# Altium footprint library ICs And Semiconductors SMD.PcbLib: 943 footprints (part 7 of 60) (continued)
## HAMAMATSU_S13361-2050NE-08 [mm] "2x2mm, 64 Channel (8x8) TSV MPPC (Multi-Pixel Photon Counter), Body 17.8 x 17.8 x 1.55mm" (continued)
  text "1" at -9.875,7.1 h1
  text "H" at 7.27,9.5 h1
  text "G" at 5.101,9.5 h1
  text "F" at 2.93,9.5 h1
  text "E" at 0.73,9.5 h1
  text "D" at -1.564,9.5 h1
  text "C" at -3.642,9.5 h1
  text "B" at -5.93,9.5 h1
  text "A" at -8.19,9.5 h1
Mechanical 15:
  lines w0.1: -9.15,-9.15 9.15,-9.15 9.15,9.15 -9.15,9.15 -9.15,-9.15
3D body "HAMAMATSU_S13361-2050NE-08_part1.stp": height 1.45, standoff 0, extent -8.9,-8.9 8.9,8.9
3D body "HAMAMATSU_S13361-2050NE-08_part2.stp": height 1.55, standoff 1.15, extent -8.9,-8.9 8.9,8.9

## HAMLIN_59170-1-X-00-C [mm] "SMD Proximity Sensor, HAMLIN 59170 Serie"
height 2.41
pads (2):
  rect 2.03x1.14 smd: 1(-7.425,0) 2(7.425,0)
Top Overlay:
  lines w0.2: -5.715,-1.145 -5.715,1.145 5.715,1.145 5.715,-1.145 -5.715,-1.145
Mechanical 8:
  lines w0.1: -7.925,0 -7.425,0 ; -7.425,-0.5 -7.425,0 ; -7.425,0.5 -7.425,0 ; -6.925,0 -7.425,0 ; -0.5,0 0,0 ; 0,-0.5 0,0 ; 0,0.5 0,0 ; 0.5,0 0,0 ; 6.925,0 7.425,0 ; 7.425,-0.5 7.425,0 ; 7.425,0.5 7.425,0 ; 7.925,0 7.425,0 ; -8.44,-0.57 -6.41,-0.57 -6.41,0.57 -8.44,0.57 -8.44,-0.57 ; 6.41,-0.57 8.44,-0.57 8.44,0.57 6.41,0.57 6.41,-0.57
Mechanical 14:
  lines w0.1: -5.715,-0.215 -8.125,-0.215 -8.125,0.215 -5.715,0.215 ; 5.715,-0.215 8.125,-0.215 8.125,0.215 5.715,0.215 ; -5.715,-1.145 -5.715,1.145 5.715,1.145 5.715,-1.145 -5.715,-1.145
3D body "HAMLIN_59170-1-X-00-C.stp": height 2.29, standoff 0, extent -8.125,-1.145 8.125,1.145

## HOEBEN_HE244S [mm] "HE244 Series Analog Hall Sensor, Body 3mm x 5mm X 0.8mm"
height 0.8
Top Overlay:
  lines w0.2: -1.5,-3.15 1.5,-3.15 ; -1.5,-4.45 1.5,-4.45 1.5,0.55 -1.5,0.55 -1.5,-4.45 ; -1.3,-4.3 -1.3,-3.15 -1.1,-3.15 -1.1,-4.3 -1.3,-4.3 ; -0.5,-4.3 -0.5,-3.15 -0.3,-3.15 -0.3,-4.3 -0.5,-4.3 ; 0.3,-4.3 0.3,-3.15 0.5,-3.15 0.5,-4.3 0.3,-4.3 ; 1.1,-4.3 1.1,-3.15 1.3,-3.15 1.3,-4.3 1.1,-4.3
  text "1" at 0.85,-2.775 h1
Mechanical 8:
  lines w0.1: -0.5,0 0,0 ; 0,-0.5 0,0 ; 0,0.5 0,0 ; 0.15,-1 0.375,-1 0.375,-0.375 0.2,-0.2 ; 0.425,-0.2 0.2,-0.2 ; 0.5,0 0,0 ; 0.2,-0.2 0.2,-0.425 0.2,-0.2
  text "Die" at -1.3,-1.175 h0.5
  text "Center" at -1.325,-1.875 h0.5
Mechanical 14:
  lines w0.1: -1.5,-3.15 1.5,-3.15 ; -1.5,-4.45 1.5,-4.45 1.5,0.55 -1.5,0.55 -1.5,-4.45 ; -1.35,-4.35 -1.35,-3.15 -1.05,-3.15 -1.05,-4.35 -1.35,-4.35 ; -0.55,-4.35 -0.55,-3.15 -0.25,-3.15 -0.25,-4.35 -0.55,-4.35 ; -0.2,-0.2 0.2,-0.2 0.2,0.2 -0.2,0.2 -0.2,-0.2 ; 0.25,-4.35 0.25,-3.15 0.55,-3.15 0.55,-4.35 0.25,-4.35 ; 1.05,-4.35 1.05,-3.15 1.35,-3.15 1.35,-4.35 1.05,-4.35
  text "1" at 0.85,-2.775 h1
Mechanical 15:
  lines w0.05: -1.75,-4.7 1.75,-4.7 1.75,0.8 -1.75,0.8 -1.75,-4.7
3D body "HOEBEN_HE244S.stp": height 0.8, standoff 0, extent -1.5,-4.45 1.5,0.55

## HOEBEN_HE444 [mm] "HE444 Series 3D Analog Hall sensor, Body 3.3mm x 3.3mm X 3.3mm"
height 3.3
pads (16):
  rect 0.8x0.35 smd: 1(-1.6,0.825) 2(-1.6,0.275) 3(-1.6,-0.275) 4(-1.6,-0.825) 9(1.6,-0.825) 10(1.6,-0.275) 11(1.6,0.275) 12(1.6,0.825)
  rect 0.35x0.8 smd: 5(-0.825,-1.6) 6(-0.275,-1.6) 7(0.275,-1.6) 8(0.825,-1.6) 13(0.825,1.6) 14(0.275,1.6) 15(-0.275,1.6) 16(-0.825,1.6)
Top Overlay:
  circle w0.25: c-2.6,0.825 r0.125
  lines w0.2: -1.65,-1.35 -1.65,-1.65 -1.35,-1.65 ; -1.65,1.35 -1.65,1.41 -1.41,1.65 -1.35,1.65 ; 1.35,-1.65 1.65,-1.65 1.65,-1.35 ; 1.35,1.65 1.65,1.65 1.65,1.35
Mechanical 14:
  lines w0.1: -1.65,0.65 -0.65,1.65 ; -1.65,0.75 -0.75,1.65 ; -1.65,0.85 -0.85,1.65 ; -1.65,0.95 -0.95,1.65 ; -1.65,1.05 -1.05,1.65 ; -1.65,1.15 -1.15,1.65 ; -1.65,1.25 -1.25,1.65 ; -1.65,1.35 -1.35,1.65 ; -1.65,1.45 -1.45,1.65 ; -1.65,1.55 -1.55,1.65 ; -1.65,-1.65 -1.65,1.65 1.65,1.65 1.65,-1.65 -1.65,-1.65
  text "Z" at 0.6,-0.3 h0.5
  text "Y" at -0.175,-0.95 h0.5
  text "NC" at -0.375,0.5 h0.5
  text "X" at -0.975,-0.325 h0.5
Mechanical 15:
  circle w0.05: c0,0 r0.35
  lines w0.05: -0.5,0 0.5,0 ; 0,-0.5 0,0.5 ; -2.25,-2.25 -2.25,2.25 2.25,2.25 2.25,-2.25 -2.25,-2.25
3D body "HOEBEN_HE444.stp": height 3.31, standoff 0, extent -1.66,-1.66 1.66,1.66

## INFINEON-PG-SOT343-4 [mm] "INFINEON PG-SOT343-4, SOT343, 1.30mm Pitch; 4 Pin,1.25mm W X 2.00mm L X 1.10mm H body, IPC Medium Density"
height 1.1
pads (4):
  rect 0.8x0.6 smd: 1(-0.8,0.65) 3(0.8,-0.65) 4(0.8,0.65)
  rect 0.8x0.9 smd: 2(-0.8,-0.5)
Top Overlay:
  circle w0.25: c-1.2,1.4 r0.125
  lines w0.2: 0,-1.1 0,1.1
Mechanical 8:
  lines w0.1: -1.3,-0.5 -0.8,-0.5 ; -1.3,0.65 -0.8,0.65 ; -0.8,-1 -0.8,-0.5 ; -0.8,0 -0.8,-0.5 ; -0.8,0.15 -0.8,0.65 ; -0.8,1.15 -0.8,0.65 ; -0.5,0 0,0 ; -0.3,-0.5 -0.8,-0.5 ; -0.3,0.65 -0.8,0.65 ; 0,-0.5 0,0 ; 0,0.5 0,0 ; 0.3,-0.65 0.8,-0.65 ; 0.3,0.65 0.8,0.65 ; 0.5,0 0,0 ; 0.8,-1.15 0.8,-0.65 ; 0.8,-0.15 0.8,-0.65 ; 0.8,0.15 0.8,0.65 ; 0.8,1.15 0.8,0.65 ; 1.3,-0.65 0.8,-0.65 ; 1.3,0.65 0.8,0.65 ; -1.2,-0.95 -0.4,-0.95 -0.4,-0.05 -1.2,-0.05 -1.2,-0.95 ; -1.2,0.35 -0.4,0.35 -0.4,0.95 -1.2,0.95 -1.2,0.35 ; 0.4,-0.95 1.2,-0.95 1.2,-0.35 0.4,-0.35 0.4,-0.95 ; 0.4,0.35 1.2,0.35 1.2,0.95 0.4,0.95 0.4,0.35
Mechanical 14:
  circle w0.1: c-0.342,0.8 r0.15
  lines w0.1: -0.675,-1.1 -0.675,1.1 0.675,1.1 0.675,-1.1 -0.675,-1.1
Mechanical 15:
  lines w0.05: -1.45,-1.35 1.45,-1.35 1.45,1.35 -1.45,1.35 -1.45,-1.35
3D body "INFINEON-PG-SOT343-4.stp": height 1.1, standoff 0, extent -1.05,-1.1 1.05,1.1

## INFINEON-PG-SOT343-4 - IPC [mm] "INFINEON PG-SOT343-4, SOT343, 1.30mm Pitch; 4 Pin,1.25mm W X 2.00mm L X 1.10mm H body, IPC Medium Density"
height 1.1
pads (4):
  rect 0.85x0.5 smd: 1(-1.05,0.65) 3(1.05,-0.65) 4(1.05,0.65)
  rect 0.85x0.8 smd: 2(-1.05,-0.5)
Top Overlay:
  circle w0.25: c-1.2,1.4 r0.125
  lines w0.2: -0.3,-1 -0.3,1 0.3,1 0.3,-1 -0.3,-1
Mechanical 14:
  lines w0.1: -0.625,0 0.375,1 ; -0.625,0.1 0.275,1 ; -0.625,0.2 0.175,1 ; -0.625,0.3 0.075,1 ; -0.625,0.4 -0.025,1 ; -0.625,0.5 -0.125,1 ; -0.625,0.6 -0.225,1 ; -0.625,0.7 -0.325,1 ; -0.625,0.8 -0.425,1 ; -0.625,0.9 -0.525,1 ; -0.625,-1 -0.625,1 0.625,1 0.625,-1 -0.625,-1
Mechanical 15:
  circle w0.05: c0,0 r0.35
  lines w0.05: -0.5,0 0.5,0 ; 0,-0.5 0,0.5 ; -1.75,-1.35 -1.75,1.35 1.75,1.35 1.75,-1.35 -1.75,-1.35
3D body "INFINEON-PG-SOT343-4.stp": height 1.1, standoff 0, extent -1.05,-1.1 1.05,1.1

## INFINEON-PG-TDSON-8 [mm] "TDSON, 8-Leads, Body 6.15x5.15mm, Pitch 1.27mm"
height 1
pads (9):
  rect 1.2x0.65 smd: 1(-2.825,1.905) 2(-2.825,0.635) 3(-2.825,-0.635) 4(-2.825,-1.905)
  rect 4.5x4.7 smd: D(0.675,0)
  rect 1.2x0.7 smd: D(2.825,-2) D(2.825,-0.665) D(2.825,0.665) D(2.825,2)
Top Overlay:
  circle w0.25: c-3.925,1.95 r0.125
  lines w0.2: -2.95,-2.53 -2.95,-2.575 -1.875,-2.575 ; -2.95,2.53 -2.95,2.575 -1.875,2.575 ; -1.275,-2.65 -1.275,-2.695 -0.835,-2.695 -0.835,-2.65 ; -1.275,2.65 -1.275,2.695 -0.835,2.695 -0.835,2.65
Mechanical 8:
  lines w0.1: -0.354,-0.354 0,0 ; -0.354,0.354 0,0 ; 0.175,0 0.675,0 ; 0.354,-0.354 0,0 ; 0.354,0.354 0,0 ; 0.675,-0.5 0.675,0 ; 0.675,0.5 0.675,0 ; 1.175,0 0.675,0 ; -3.425,-2.23 -2.825,-1.905 -3.425,-1.58 ; -3.425,-2.23 -2.225,-2.23 -2.225,-1.58 -3.425,-1.58 ; -3.425,-2.23 -3.425,-1.58 ; -3.425,-0.96 -2.825,-0.635 -3.425,-0.31 ; -3.425,-0.96 -2.225,-0.96 -2.225,-0.31 -3.425,-0.31 ; -3.425,-0.96 -3.425,-0.31 ; -3.425,0.31 -2.825,0.635 -3.425,0.96 ; -3.425,0.31 -2.225,0.31 -2.225,0.96 -3.425,0.96 ; -3.425,0.31 -3.425,0.96 ; -3.425,1.58 -2.825,1.905 -3.425,2.23 ; -3.425,1.58 -2.225,1.58 -2.225,2.23 -3.425,2.23 ; -3.425,1.58 -3.425,2.23 ; -1.575,-2.35 2.925,2.35 -1.575,2.35 ; -1.575,-2.35 -1.575,2.35 ; -1.575,-2.35 2.925,-2.35 -1.575,2.35 ; 3.425,-2.35 3.425,-1.65 ; 3.425,-2.35 2.825,-2 3.425,-1.65 ; 3.425,-2.35 3.425,-1.65 ; 3.425,-2.35 2.225,-2.35 2.225,-1.65 3.425,-1.65 ; 3.425,-1.65 2.925,-1.65 2.925,-1.015 3.425,-1.015 ; 3.425,-1.015 3.425,-0.315 ; 3.425,-1.015 2.825,-0.665 3.425,-0.315 ; 3.425,-1.015 3.425,-0.315 ; 3.425,-1.015 2.225,-1.015 2.225,-0.315 3.425,-0.315 ; 3.425,-0.315 2.925,-0.315 2.925,0.315 3.425,0.315 ; 3.425,0.315 3.425,1.015 ; 3.425,0.315 2.825,0.665 3.425,1.015 ; 3.425,0.315 3.425,1.015 ; 3.425,0.315 2.225,0.315 2.225,1.015 3.425,1.015 ; 3.425,1.015 2.925,1.015 2.925,1.65 3.425,1.65 ; 3.425,1.65 3.425,2.35 ; 3.425,1.65 2.825,2 3.425,2.35 ; 3.425,1.65 3.425,2.35 ; 3.425,1.65 2.225,1.65 2.225,2.35 3.425,2.35
Mechanical 14:
  lines w0.1: -2.95,-2.125 -3.075,-2.125 -3.075,-1.685 -2.95,-1.685 ; -2.95,-0.855 -3.075,-0.855 -3.075,-0.415 -2.95,-0.415 ; -2.95,0.415 -3.075,0.415 -3.075,0.855 -2.95,0.855 ; -2.95,1.575 -1.95,2.575 ; -2.95,1.675 -2.05,2.575 ; -2.95,1.685 -3.075,1.685 -3.075,2.125 -2.95,2.125 ; -2.95,1.775 -2.15,2.575 ; -2.95,1.875 -2.25,2.575 ; -2.95,1.975 -2.35,2.575 ; -2.95,2.075 -2.45,2.575 ; -2.95,2.175 -2.55,2.575 ; -2.95,2.275 -2.65,2.575 ; -2.95,2.375 -2.75,2.575 ; -2.95,2.475 -2.85,2.575 ; -1.275,-2.575 -1.275,-2.695 -0.835,-2.695 -0.835,-2.575 ; -1.275,2.575 -1.275,2.695 -0.835,2.695 -0.835,2.575 ; 2.95,-2.125 3.075,-2.125 3.075,-1.685 2.95,-1.685 ; 2.95,-0.855 3.075,-0.855 3.075,-0.415 2.95,-0.415 ; 2.95,0.415 3.075,0.415 3.075,0.855 2.95,0.855 ; 2.95,1.685 3.075,1.685 3.075,2.125 2.95,2.125 ; -2.95,-2.575 -2.95,2.575 2.95,2.575 2.95,-2.575 -2.95,-2.575
Mechanical 15:
  lines w0.05: -3.675,-2.945 -3.675,2.945 3.675,2.945 3.675,-2.945 -3.675,-2.945
3D body "INFINEON-PG-TDSON-8.stp": height 1.1, standoff 0, extent -3.075,-2.75 3.075,2.75

## INFINEON-PG-TSDSON-8 [mm] "TSDSON, 8-Leads, Body 3.4x3.4mm, Pitch 0.65mm"
height 1.1
pads (9):
  rect 0.8x0.34 smd: 1(-1.5,0.975) 2(-1.5,0.325) 3(-1.5,-0.325) 4(-1.5,-0.975)
  rect 1.71x2.29 smd: D(0.395,0)
  rect 0.65x0.34 smd: D(1.575,-0.975) D(1.575,-0.325) D(1.575,0.325) D(1.575,0.975)
Top Overlay:
  circle w0.25: c-2.6,1.02 r0.125
  lines w0.2: -1.7,-1.495 -1.7,-1.7 1.7,-1.7 1.7,-1.495 ; -1.7,1.495 -1.7,1.7 1.7,1.7 1.7,1.495
Mechanical 8:
  lines w0.05: -0.354,-0.354 0,0 ; -0.354,0.354 0,0 ; -0.105,0 0.395,0 ; 0.354,-0.354 0,0 ; 0.354,0.354 0,0 ; 0.395,-0.5 0.395,0 ; 0.395,0.5 0.395,0 ; 0.895,0 0.395,0 ; -1.9,-1.145 -1.5,-0.975 -1.9,-0.805 ; -1.9,-1.145 -1.9,-0.805 ; -1.9,-1.145 -1.1,-1.145 -1.1,-0.805 -1.9,-0.805 ; -1.9,-0.495 -1.5,-0.325 -1.9,-0.155 ; -1.9,-0.495 -1.9,-0.155 ; -1.9,-0.495 -1.1,-0.495 -1.1,-0.155 -1.9,-0.155 ; -1.9,0.155 -1.5,0.325 -1.9,0.495 ; -1.9,0.155 -1.9,0.495 ; -1.9,0.155 -1.1,0.155 -1.1,0.495 -1.9,0.495 ; -1.9,0.805 -1.5,0.975 -1.9,1.145 ; -1.9,0.805 -1.9,1.145 ; -1.9,0.805 -1.1,0.805 -1.1,1.145 -1.9,1.145 ; 1.9,-1.145 1.575,-0.975 1.9,-0.805 ; 1.9,-1.145 -0.46,-1.145 -0.46,1.145 1.9,1.145 ; 1.9,-1.145 1.9,-0.805 ; 1.9,-0.805 1.25,-0.805 1.25,-0.495 1.9,-0.495 ; 1.9,-0.495 1.575,-0.325 1.9,-0.155 ; 1.9,-0.495 1.9,-0.155 ; 1.9,-0.155 1.25,-0.155 1.25,0.155 1.9,0.155 ; 1.9,0.155 1.575,0.325 1.9,0.495 ; 1.9,0.155 1.9,0.495 ; 1.9,0.495 1.25,0.495 1.25,0.805 1.9,0.805 ; 1.9,0.805 1.575,0.975 1.9,1.145 ; 1.9,0.805 1.9,1.145
Mechanical 14:
  lines w0.1: -1.7,-1.7 -1.7,1.7 1.7,1.7 1.7,-1.7 -1.6,-1.7 ; -1.7,0.7 -0.7,1.7 ; -1.7,0.8 -0.8,1.7 ; -1.7,0.9 -0.9,1.7 ; -1.7,1 -1,1.7 ; -1.7,1.1 -1.1,1.7 ; -1.7,1.2 -1.2,1.7 ; -1.7,1.3 -1.3,1.7 ; -1.7,1.4 -1.4,1.7 ; -1.7,1.5 -1.5,1.7 ; -1.7,1.6 -1.6,1.7
Mechanical 15:
  lines w0.05: -2.15,-1.95 2.15,-1.95 2.15,1.95 -2.15,1.95 -2.15,-1.95
3D body "INFINEON-PG-TSDSON-8.stp": height 1, standoff 0, extent -1.7,-1.7 1.7,1.7

## INTERSIL_L72.10x10E [mm] "INTERSIL Case Style L72.10x10E, QFN, 0.50mm Pitch, Square; 72 Pin, 10.00mm L X 10.00mm W X 1.00mm H body (w/ Thermal Tab 7.15 X 6mm)"
height 0.9
pads (75):
  oval 0.9x0.25 smd: 1(-4.95,4.25) 2(-4.95,3.75) 3(-4.95,3.25) 4(-4.95,2.75) 5(-4.95,2.25) 6(-4.95,1.75) 7(-4.95,1.25) 8(-4.95,0.75) 9(-4.95,0.25) 10(-4.95,-0.25) 11(-4.95,-0.75) 12(-4.95,-1.25) 13(-4.95,-1.75) 14(-4.95,-2.25) 15(-4.95,-2.75) 16(-4.95,-3.25) 17(-4.95,-3.75) 18(-4.95,-4.25) 37(4.95,-4.25) 38(4.95,-3.75) 39(4.95,-3.25) 40(4.95,-2.75) 41(4.95,-2.25) 42(4.95,-1.75) 43(4.95,-1.25) 44(4.95,-0.75) 45(4.95,-0.25) 46(4.95,0.25) 47(4.95,0.75) 48(4.95,1.25) 49(4.95,1.75) 50(4.95,2.25) 51(4.95,2.75) 52(4.95,3.25) 53(4.95,3.75) 54(4.95,4.25)
  oval 0.25x0.9 smd: 19(-4.25,-4.95) 20(-3.75,-4.95) 21(-3.25,-4.95) 22(-2.75,-4.95) 23(-2.25,-4.95) 24(-1.75,-4.95) 25(-1.25,-4.95) 26(-0.75,-4.95) 27(-0.25,-4.95) 28(0.25,-4.95) 29(0.75,-4.95) 30(1.25,-4.95) 31(1.75,-4.95) 32(2.25,-4.95) 33(2.75,-4.95) 34(3.25,-4.95) 35(3.75,-4.95) 36(4.25,-4.95) 55(4.25,4.95) 56(3.75,4.95) 57(3.25,4.95) 58(2.75,4.95) 59(2.25,4.95) 60(1.75,4.95) 61(1.25,4.95) 62(0.75,4.95) 63(0.25,4.95) 64(-0.25,4.95) 65(-0.75,4.95) 66(-1.25,4.95) 67(-1.75,4.95) 68(-2.25,4.95) 69(-2.75,4.95) 70(-3.25,4.95) 71(-3.75,4.95) 72(-4.25,4.95)
  rect 7.15x6 smd: 73(-0.575,0)
  round 1 smd paste-0.51 mask+0.5: FTG1(-5.707,-5.707) FTG2(5.707,5.707)
Top Layer keep-out:
  circle w0.1: c-5.707,-5.707 r1
  circle w0.1: c5.707,5.707 r1
Top Overlay:
  circle w0.25: c-6,4.25 r0.125
  lines w0.2: -5,-4.75 -5,-5 -4.75,-5 ; -5,4.75 -5,4.8 -4.8,5 -4.75,5 ; 4.75,-5 5,-5 5,-4.75 ; 4.75,5 5,5 5,4.75
Top Paste:
  region: -3.545,-2.2 -1.965,-2.2 -1.965,-0.4 -3.545,-0.4
  region: -1.365,-2.2 0.215,-2.2 0.215,-0.4 -1.365,-0.4
  region: 0.815,-2.2 2.395,-2.2 2.395,-0.4 0.815,-0.4
  region: -3.545,0.4 -1.965,0.4 -1.965,2.2 -3.545,2.2
  region: -1.365,0.4 0.215,0.4 0.215,2.2 -1.365,2.2
  region: 0.815,0.4 2.395,0.4 2.395,2.2 0.815,2.2
Mechanical 14:
  circle w0.1: c-4,4 r0.5
  lines w0.1: -5,-5 5,-5 5,5 -5,5 -5,-5
Mechanical 15:
  circle w0.05: c0,0 r0.35
  lines w0.05: -0.5,0 0.5,0 ; 0,-0.5 0,0.5 ; -5.65,-5.65 5.65,-5.65 5.65,5.65 -5.65,5.65 -5.65,-5.65
3D body "INTERSIL_L72.10x10E.stp": height 0.9, standoff 0, extent -5,-5 5,5

## IR_DIRECTFET-L8 [mm] "INTERNATIONAL RECTIFIER DirectFET L8 (Large Size Can) Outline, Body 9.1x6.97mm"
height 0.74
pads (15):
  rect 1.1x1.7 smd: D(-4.35,-2.2) D(-4.35,0) D(-4.35,2.2) D(4.35,-2.2) D(4.35,0) D(4.35,2.2)
  rect 0.7x1.3 smd: G(-2.1,0)
  rect 1.1x0.85 smd: S(-0.7,-1.725) S(-0.7,-0.575) S(-0.7,0.575) S(-0.7,1.725) S(2.1,-1.725) S(2.1,-0.575) S(2.1,0.575) S(2.1,1.725)
Top Overlay:
  lines w0.2: -3.838,-3.4 -3.75,-3.487 3.75,-3.487 3.838,-3.4 ; -3.838,3.4 -3.75,3.487 3.75,3.487 3.838,3.4 ; -3.45,-3.356 ccw(c-3.35,-2.987) -3.35,-3.369 3.35,-3.369 ccw(c3.35,-2.987) 3.45,-3.356 ; -3.45,3.356 cw(c-3.35,2.987) -3.35,3.369 3.35,3.369 cw(c3.35,2.987) 3.45,3.356
Mechanical 8:
  lines w0.1: -4.85,-2.2 -4.35,-2.2 ; -4.85,0 -4.35,0 ; -4.85,2.2 -4.35,2.2 ; -4.35,-2.7 -4.35,-2.2 ; -4.35,-1.7 -4.35,-2.2 ; -4.35,-0.5 -4.35,0 ; -4.35,0.5 -4.35,0 ; -4.35,1.7 -4.35,2.2 ; -4.35,2.7 -4.35,2.2 ; -3.85,-2.2 -4.35,-2.2 ; -3.85,0 -4.35,0 ; -3.85,2.2 -4.35,2.2 ; -2.6,0 -2.1,0 ; -2.1,-0.5 -2.1,0 ; -2.1,0.5 -2.1,0 ; -1.6,0 -2.1,0 ; -1.2,-1.725 -0.7,-1.725 ; -1.2,-0.575 -0.7,-0.575 ; -1.2,0.575 -0.7,0.575 ; -1.2,1.725 -0.7,1.725 ; -0.7,-2.225 -0.7,-1.725 ; -0.7,-1.225 -0.7,-1.725 ; -0.7,-1.075 -0.7,-0.575 ; -0.7,-0.075 -0.7,-0.575 ; -0.7,0.075 -0.7,0.575 ; -0.7,1.075 -0.7,0.575 ; -0.7,1.225 -0.7,1.725 ; -0.7,2.225 -0.7,1.725 ; -0.5,0 0,0 ; -0.2,-1.725 -0.7,-1.725 ; -0.2,-0.575 -0.7,-0.575 ; -0.2,0.575 -0.7,0.575 ; -0.2,1.725 -0.7,1.725 ; 0,-0.5 0,0 ; 0,0.5 0,0 ; 0.5,0 0,0 ; 1.6,-1.725 2.1,-1.725 ; 1.6,-0.575 2.1,-0.575 ; 1.6,0.575 2.1,0.575 ; 1.6,1.725 2.1,1.725 ; 2.1,-2.225 2.1,-1.725 ; 2.1,-1.225 2.1,-1.725 ; 2.1,-1.075 2.1,-0.575 ; 2.1,-0.15 2.1,0.15 ; 2.1,-0.075 2.1,-0.575 ; 2.1,0.075 2.1,0.575 ; 2.1,1.075 2.1,0.575 ; 2.1,1.225 2.1,1.725 ; 2.1,2.225 2.1,1.725 ; 2.6,-1.725 2.1,-1.725 ; 2.6,-0.575 2.1,-0.575 ; 2.6,0.575 2.1,0.575 ; 2.6,1.725 2.1,1.725 ; 3.85,-2.2 4.35,-2.2 ; 3.85,0 4.35,0 ; 3.85,2.2 4.35,2.2 ; 4.35,-2.7 4.35,-2.2 ; 4.35,-1.7 4.35,-2.2 ; 4.35,-0.5 4.35,0 ; 4.35,0.5 4.35,0 ; 4.35,1.7 4.35,2.2 ; 4.35,2.7 4.35,2.2 ; 4.85,-2.2 4.35,-2.2 ; 4.85,0 4.35,0 ; 4.85,2.2 4.35,2.2 ; -4.9,-3.05 -3.8,-3.05 -3.8,-1.35 -4.9,-1.35 -4.9,-3.05 ; -4.9,-0.85 -3.8,-0.85 -3.8,0.85 -4.9,0.85 -4.9,-0.85 ; -4.9,1.35 -3.8,1.35 -3.8,3.05 -4.9,3.05 -4.9,1.35 ; -2.45,-0.65 -1.75,-0.65 -1.75,0.65 -2.45,0.65 -2.45,-0.65 ; -1.25,-2.15 -1.25,-1.3 -0.15,-1.3 -0.15,-2.15 -1.25,-2.15 ; -1.25,-1 -1.25,-0.15 -0.15,-0.15 -0.15,-1 -1.25,-1 ; -1.25,0.15 -1.25,1 -0.15,1 -0.15,0.15 -1.25,0.15 ; -1.25,1.3 -1.25,2.15 -0.15,2.15 -0.15,1.3 -1.25,1.3 ; 1.55,-2.15 1.55,-1.3 2.65,-1.3 2.65,-2.15 1.55,-2.15 ; 1.55,-1 1.55,-0.15 2.65,-0.15 2.65,-1 1.55,-1 ; 1.55,0.15 1.55,1 2.65,1 2.65,0.15 1.55,0.15 ; 1.55,1.3 1.55,2.15 2.65,2.15 2.65,1.3 1.55,1.3 ; 3.8,-3.05 4.9,-3.05 4.9,-1.35 3.8,-1.35 3.8,-3.05 ; 3.8,-0.85 4.9,-0.85 4.9,0.85 3.8,0.85 3.8,-0.85 ; 3.8,1.35 4.9,1.35 4.9,3.05 3.8,3.05 3.8,1.35
Mechanical 14:
  lines w0.1: -3.9,-3.025 -3.95,-2.975 -4.55,-2.975 -4.55,2.975 -3.95,2.975 -3.9,3.025 ; 3.9,3.025 3.95,2.975 4.55,2.975 4.55,-2.975 3.95,-2.975 3.901,-3.013 ; 3.9,3.337 3.75,3.487 -3.75,3.487 -3.9,3.337 -3.9,-3.337 -3.75,-3.487 3.75,-3.487 3.9,-3.337 3.901,3.339 ; -3.732,-2.987 ccw(c-3.35,-2.987) -3.35,-3.369 3.35,-3.369 ccw(c3.35,-2.987) 3.732,-2.987 3.732,2.987 ccw(c3.35,2.987) 3.35,3.369 -3.35,3.369 ccw(c-3.35,2.987) -3.732,2.987 -3.732,-2.987
Mechanical 15:
  lines w0.05: -5.15,-3.3 -5.15,3.3 -4.15,3.3 -4.15,3.738 4.149,3.738 4.151,3.3 5.15,3.3 5.15,-3.3 4.15,-3.3 4.15,-3.738 -4.15,-3.738 -4.15,-3.3 -5.15,-3.3
3D body "IR_DIRECTFET-L8.stp": height 0.74, standoff 0, extent -4.55,-3.487 4.55,3.488

## IST_P14-FEMTOCAP-G [mm] "Chip SMD, Body 4 x 2mm"
height 0.5
pads (2):
  rect 1.15x2.2 smd: 1(-1.9,0) 2(1.9,0)
Top Overlay:
  lines w0.1: -0.975,-1.1 0.975,-1.1 ; -0.975,1.1 0.975,1.1
Mechanical 8:
  lines w0.1: -2.4,0 -1.9,0 ; -1.9,-0.5 -1.9,0 ; -1.9,0.5 -1.9,0 ; -1.4,0 -1.9,0 ; -0.5,0 0,0 ; 0,-0.5 0,0 ; 0,0.5 0,0 ; 0.5,0 0,0 ; 1.4,0 1.9,0 ; 1.9,-0.5 1.9,0 ; 1.9,0.5 1.9,0 ; 2.4,0 1.9,0 ; -2.475,-1.1 -1.325,-1.1 -1.325,1.1 -2.475,1.1 -2.475,-1.1 ; 1.325,-1.1 2.475,-1.1 2.475,1.1 1.325,1.1 1.325,-1.1
Mechanical 14:
  lines w0.1: -2.1,-1.1 2.1,-1.1 2.1,1.1 -2.1,1.1 -2.1,-1.1
Mechanical 15:
  lines w0.1: -2.725,-1.35 -2.725,1.35 2.725,1.35 2.725,-1.35 -2.725,-1.35
3D body "IST_P14-FEMTOCAP-G.stp": height 0.5, standoff 0, extent -2.1,-1.1 2.1,1.1

## IXYS_DE275 [mm] "IXYS DIRECT ENERGY INC. Case DE275"
height 2.67
pads (6):
  rect 7.95x3.5 smd: 1(-14.425,5.715) 3(-14.425,-5.715) 4(14.425,-5.715) 6(14.425,5.715)
  rect 7.95x4.77 smd: 2(-14.425,0)
  rect 7.95x5.79 smd: 5(14.425,0)
Top Overlay:
  lines w0.2: -6.73,-5.5 -6.73,-6.73 -5.5,-6.73 ; -6.73,-4.5 -6.73,-3.5 ; -6.73,-2.5 -6.73,-1.5 ; -6.73,-0.5 -6.73,0.5 ; -6.73,1.5 -6.73,2.5 ; -6.73,3.5 -6.73,4.5 ; -6.73,5.5 -6.73,6.73 -5.5,6.73 ; -4.5,-6.73 -3.5,-6.73 ; -4.5,6.73 -3.5,6.73 ; -2.5,-6.73 -1.5,-6.73 ; -2.5,6.73 -1.5,6.73 ; -0.5,-6.73 0.5,-6.73 ; -0.5,6.73 0.5,6.73 ; 1.5,-6.73 2.5,-6.73 ; 1.5,6.73 2.5,6.73 ; 3.5,-6.73 4.5,-6.73 ; 3.5,6.73 4.5,6.73 ; 5.5,-6.73 6.73,-6.73 6.73,-5.5 ; 5.5,6.73 6.73,6.73 6.73,5.5 ; 6.73,-4.5 6.73,-3.5 ; 6.73,-2.5 6.73,-1.5 ; 6.73,-0.5 6.73,0.5 ; 6.73,1.5 6.73,2.5 ; 6.73,3.5 6.73,4.5 ; -8.255,-7.8 8.255,-7.8 8.255,7.8 -8.255,7.8 -8.255,-7.8
Mechanical 8:
  lines w0.1: -14.925,-5.715 -14.425,-5.715 ; -14.925,0 -14.425,0 ; -14.925,5.715 -14.425,5.715 ; -14.425,-6.215 -14.425,-5.715 ; -14.425,-5.215 -14.425,-5.715 ; -14.425,-0.5 -14.425,0 ; -14.425,0.5 -14.425,0 ; -14.425,5.215 -14.425,5.715 ; -14.425,6.215 -14.425,5.715 ; -13.925,-5.715 -14.425,-5.715 ; -13.925,0 -14.425,0 ; -13.925,5.715 -14.425,5.715 ; -0.5,0 0,0 ; 0,-0.5 0,0 ; 0,0.5 0,0 ; 0.5,0 0,0 ; 13.925,-5.715 14.425,-5.715 ; 13.925,0 14.425,0 ; 13.925,5.715 14.425,5.715 ; 14.425,-6.215 14.425,-5.715 ; 14.425,-5.215 14.425,-5.715 ; 14.425,-0.5 14.425,0 ; 14.425,0.5 14.425,0 ; 14.425,5.215 14.425,5.715 ; 14.425,6.215 14.425,5.715 ; 14.925,-5.715 14.425,-5.715 ; 14.925,0 14.425,0 ; 14.925,5.715 14.425,5.715 ; -18.4,-7.465 -18.4,-3.965 -10.45,-3.965 -10.45,-7.465 -18.4,-7.465 ; -18.4,-2.385 -18.4,2.385 -10.45,2.385 -10.45,-2.385 -18.4,-2.385 ; -18.4,3.965 -18.4,7.465 -10.45,7.465 -10.45,3.965 -18.4,3.965 ; -6.73,-6.73 -6.73,6.73 6.73,6.73 6.73,-6.73 -6.73,-6.73 ; 10.45,-7.465 10.45,-3.965 18.4,-3.965 18.4,-7.465 10.45,-7.465 ; 10.45,-2.895 10.45,2.895 18.4,2.895 18.4,-2.895 10.45,-2.895 ; 10.45,3.965 10.45,7.465 18.4,7.465 18.4,3.965 10.45,3.965
Mechanical 14:
  lines w0.1: -8.255,-7.365 -17.615,-7.365 -17.615,-4.065 -8.255,-4.065 ; -8.255,-2.285 -17.615,-2.285 -17.615,2.285 -8.255,2.285 ; -8.255,4.065 -17.615,4.065 -17.615,7.365 -8.255,7.365 ; -6.73,-5.5 -6.73,-6.73 -5.5,-6.73 ; -6.73,-4.5 -6.73,-3.5 ; -6.73,-2.5 -6.73,-1.5 ; -6.73,-0.5 -6.73,0.5 ; -6.73,1.5 -6.73,2.5 ; -6.73,3.5 -6.73,4.5 ; -6.73,5.5 -6.73,6.73 -5.5,6.73 ; -4.5,-6.73 -3.5,-6.73 ; -4.5,6.73 -3.5,6.73 ; -2.5,-6.73 -1.5,-6.73 ; -2.5,6.73 -1.5,6.73 ; -0.5,-6.73 0.5,-6.73 ; -0.5,6.73 0.5,6.73 ; 1.5,-6.73 2.5,-6.73 ; 1.5,6.73 2.5,6.73 ; 3.5,-6.73 4.5,-6.73 ; 3.5,6.73 4.5,6.73 ; 5.5,-6.73 6.73,-6.73 6.73,-5.5 ; 5.5,6.73 6.73,6.73 6.73,5.5 ; 6.73,-4.5 6.73,-3.5 ; 6.73,-2.5 6.73,-1.5 ; 6.73,-0.5 6.73,0.5 ; 6.73,1.5 6.73,2.5 ; 6.73,3.5 6.73,4.5 ; 8.255,-7.365 17.615,-7.365 17.615,-4.065 8.255,-4.065 ; 8.255,-2.795 17.615,-2.795 17.615,2.795 8.255,2.795 ; 8.255,4.065 17.615,4.065 17.615,7.365 8.255,7.365 ; -8.255,-7.8 8.255,-7.8 8.255,7.8 -8.255,7.8 -8.255,-7.8
3D body "DEIC420.stp": height 3.3, standoff 0, extent -17.615,-7.8 17.615,7.8